# Altium footprint library NX Module baseboard.PcbLib: 96 footprints (part 3 of 6)
Each footprint in its own frame and in the unit in brackets; x right, y up, seen from the top. Pads: shape width x height; smd on the part's side, far side on the other; paste and mask are expansions set on the pad; w line width, h text height; cw(c..) or ccw(c..) is an arc to the next point about the centre after c.
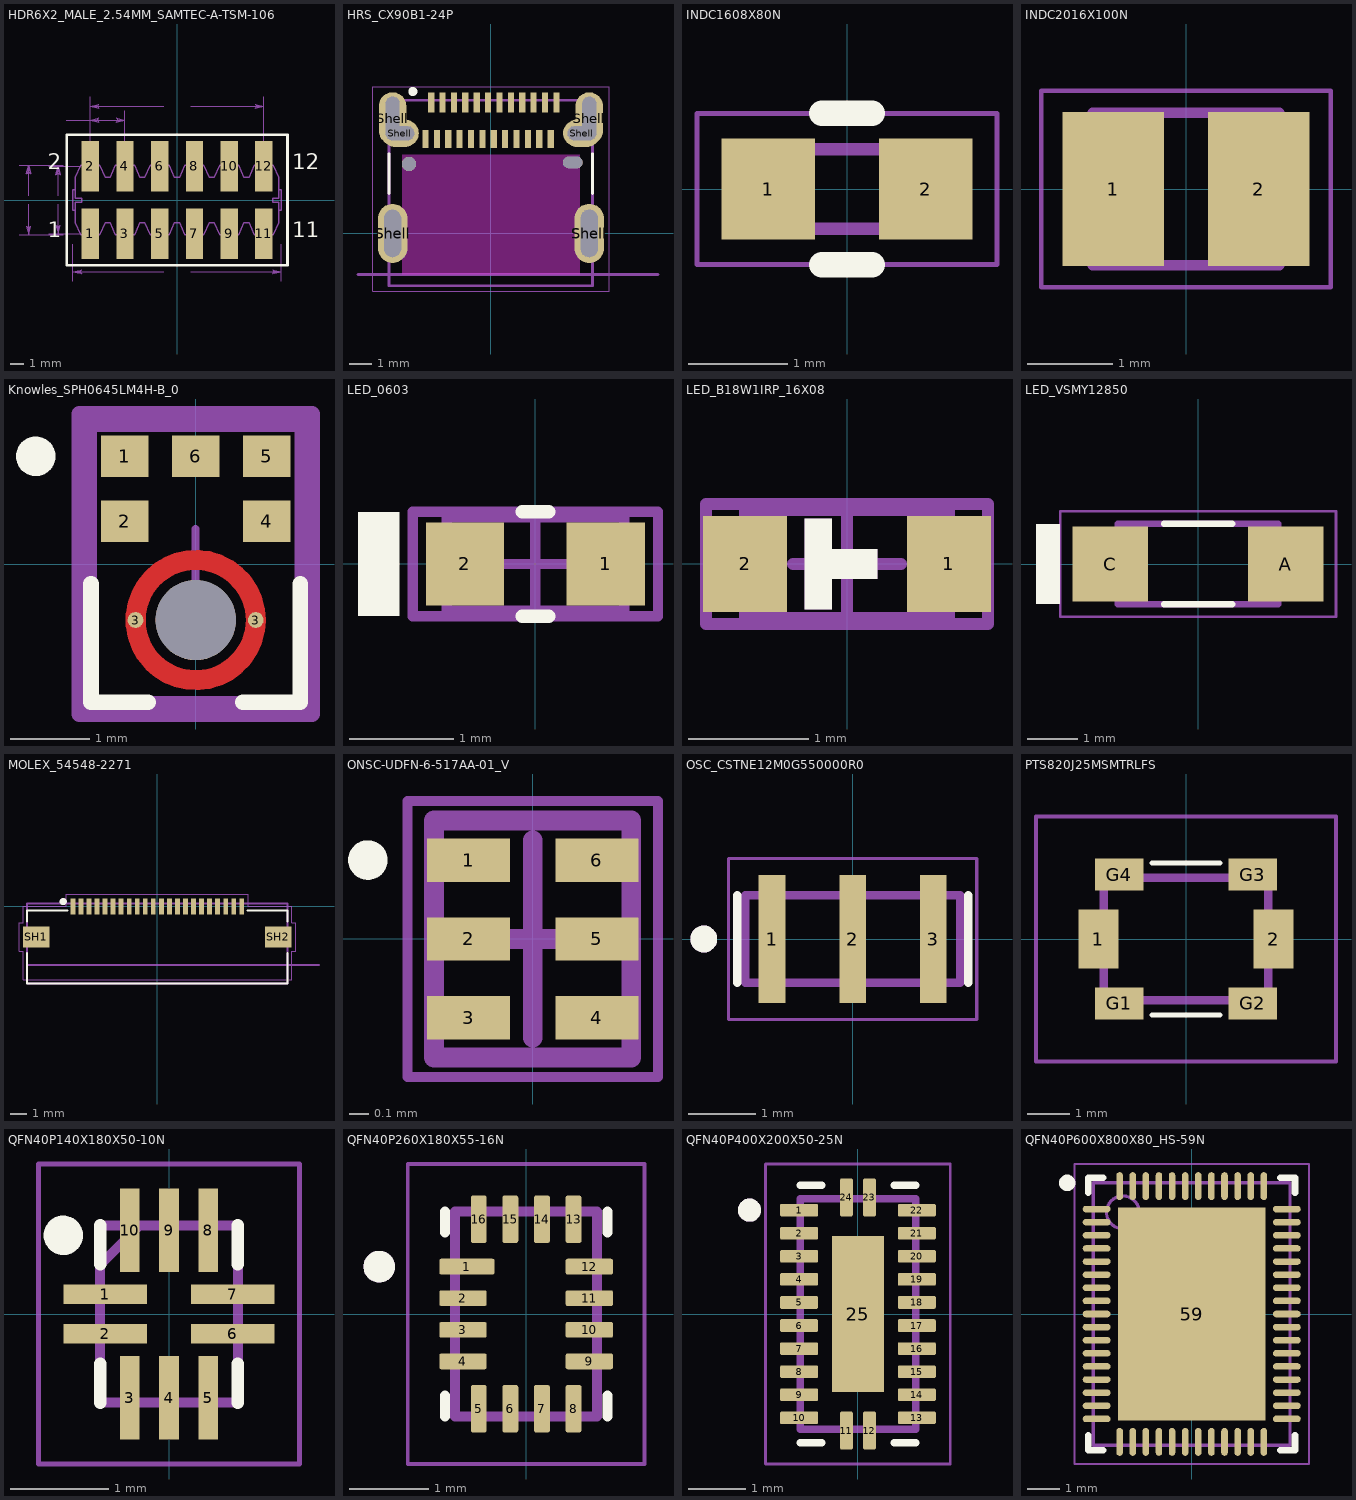
[diagram p2: the footprints below, top view; thin cyan lines are the x and y axes]

## HDR6X2_MALE_2.54MM_SAMTEC-A-TSM-106 [mm]
pads (12):
  rect 1.27x3.68 smd: 1(-6.35,-2.476) 2(-6.35,2.476) 3(-3.81,-2.476) 4(-3.81,2.476) 5(-1.27,-2.476) 6(-1.27,2.476) 7(1.27,-2.476) 8(1.27,2.476) 9(3.81,-2.476) 10(3.81,2.476) 11(6.35,-2.476) 12(6.35,2.476)
Top Overlay:
  lines w0.2: -8.07,-4.768 -8.07,4.768 8.07,4.768 8.07,-4.768 -8.07,-4.768
  text "1" at -9.44,-3.112 h1.97
  text "2" at -9.44,1.842 h1.97
  text "11" at 8.411,-3.112 h1.97
  text "12" at 8.411,1.842 h1.97
Top Paste:
  rectangle: -6.985,-4.316 -5.715,-0.636
  rectangle: -6.985,0.636 -5.715,4.316
  rectangle: -4.445,-4.316 -3.175,-0.636
  rectangle: -4.445,0.636 -3.175,4.316
  rectangle: -1.905,-4.316 -0.635,-0.636
  rectangle: -1.905,0.636 -0.635,4.316
  rectangle: 0.635,-4.316 1.905,-0.636
  rectangle: 0.635,0.636 1.905,4.316
  rectangle: 3.175,-4.316 4.445,-0.636
  rectangle: 3.175,0.636 4.445,4.316
  rectangle: 5.715,-4.316 6.985,-0.636
  rectangle: 5.715,0.636 6.985,4.316
Top Solder:
  rectangle: -7.036,-4.367 -5.664,-0.585
  rectangle: -7.036,0.585 -5.664,4.367
  rectangle: -4.496,-4.367 -3.124,-0.585
  rectangle: -4.496,0.585 -3.124,4.367
  rectangle: -1.956,-4.367 -0.584,-0.585
  rectangle: -1.956,0.585 -0.584,4.367
  rectangle: 0.584,-4.367 1.956,-0.585
  rectangle: 0.584,0.585 1.956,4.367
  rectangle: 3.124,-4.367 4.496,-0.585
  rectangle: 3.124,0.585 4.496,4.367
  rectangle: 5.664,-4.367 7.036,-0.585
  rectangle: 5.664,0.585 7.036,4.367
Mechanical 13:
  lines w0.1: -7.43,-0.762 -7.62,-0.762 -7.62,0.762 -7.43,0.762 ; -6.668,-2.54 -6.668,-3.721 -6.032,-3.721 -6.032,-2.54 ; -6.668,2.54 -6.668,3.721 -6.032,3.721 -6.032,2.54 ; -4.128,-2.54 -4.128,-3.721 -3.492,-3.721 -3.492,-2.54 ; -4.128,2.54 -4.128,3.721 -3.492,3.721 -3.492,2.54 ; -1.588,-2.54 -1.588,-3.721 -0.952,-3.721 -0.952,-2.54 ; -1.588,2.54 -1.588,3.721 -0.952,3.721 -0.952,2.54 ; 0.952,-2.54 0.952,-3.721 1.588,-3.721 1.588,-2.54 ; 0.952,2.54 0.952,3.721 1.588,3.721 1.588,2.54 ; 3.492,-2.54 3.492,-3.721 4.128,-3.721 4.128,-2.54 ; 3.492,2.54 3.492,3.721 4.128,3.721 4.128,2.54 ; 6.032,-2.54 6.032,-3.721 6.668,-3.721 6.668,-2.54 ; 6.032,2.54 6.032,3.721 6.668,3.721 6.668,2.54 ; 7.43,-0.762 7.43,-0.146 6.985,-0.146 6.985,0.146 7.43,0.146 7.43,0.762 ; 7.43,-0.762 7.62,-0.762 7.62,0.762 7.43,0.762 ; 7.43,-0.762 7.43,-1.651 7.048,-2.54 5.652,-2.54 5.27,-1.651 4.89,-1.651 4.508,-2.54 3.112,-2.54 2.73,-1.651 2.35,-1.651 1.968,-2.54 0.572,-2.54 0.19,-1.651 -0.19,-1.651 -0.572,-2.54 -1.968,-2.54 -2.35,-1.651 -2.73,-1.651 -3.112,-2.54 -4.508,-2.54 -4.89,-1.651 -5.27,-1.651 -5.652,-2.54 -7.048,-2.54 -7.43,-1.651 -7.43,-0.146 -6.985,-0.146 -6.985,0.146 -7.43,0.146 -7.43,1.651 -7.048,2.54 -5.652,2.54 -5.27,1.651 -4.89,1.651 -4.508,2.54 -3.112,2.54 -2.73,1.651 -2.35,1.651 -1.968,2.54 -0.572,2.54 -0.19,1.651 0.19,1.651 0.572,2.54 1.968,2.54 2.35,1.651 2.73,1.651 3.112,2.54 4.508,2.54 4.89,1.651 5.27,1.651 5.652,2.54 7.048,2.54 7.43,1.651 7.43,0.762
  text ".Designator" at -0.561,-0.375 h1.27
  text "12" at 8.411,1.842 h1.97
  text "11" at 8.411,-3.112 h1.97
  text "2" at -9.44,1.842 h1.97
  text "1" at -9.44,-3.112 h1.97
Mechanical 40:
  lines w0: -11.56,-2.54 -8.321,-2.54 ; -11.56,2.54 -8.321,2.54 ; -10.858,-0.318 -10.858,-2.54 ; -10.858,0.318 -10.858,2.54 ; -9.401,-2.476 -7.051,-2.476 ; -9.401,2.476 -7.051,2.476 ; -8.7,-0.318 -8.7,-2.476 ; -8.7,0.318 -8.7,2.476 ; -8.103,5.842 -6.35,5.842 ; -7.62,-5.946 -7.62,-3.241 ; -6.35,6.543 -6.35,3.178 -6.35,7.559 ; -3.81,3.178 -3.81,6.543 ; -0.991,-5.245 -7.62,-5.245 ; -0.991,6.858 -6.35,6.858 ; 0.991,-5.245 7.62,-5.245 ; 0.991,6.858 6.35,6.858 ; 6.35,3.178 6.35,7.559 ; 7.62,-5.946 7.62,-3.241 ; -11.017,-1.905 -10.858,-2.54 ; -11.017,-1.905 -10.858,-2.032 ; -11.017,-1.905 -10.938,-1.968 -10.858,-2.54 ; -10.858,-2.54 -10.7,-1.905 -10.858,-2.032 ; -10.858,-2.54 -10.779,-1.968 -10.858,-2.032 ; -10.858,-2.54 -10.858,-2.032 ; -10.858,2.032 -11.017,1.905 -10.858,2.54 ; -10.858,2.032 -10.7,1.905 ; -10.858,2.032 -10.938,1.968 -10.858,2.54 ; -10.858,2.032 -10.858,2.54 ; -10.858,2.54 -10.7,1.905 ; -10.858,2.54 -10.779,1.968 -10.7,1.905 ; -8.858,-1.842 -8.7,-2.476 ; -8.858,-1.842 -8.7,-1.968 ; -8.858,-1.842 -8.779,-1.905 -8.7,-2.476 ; -8.7,-2.476 -8.541,-1.842 -8.7,-1.968 ; -8.7,-2.476 -8.62,-1.905 -8.7,-1.968 ; -8.7,-2.476 -8.7,-1.968 ; -8.7,1.968 -8.858,1.842 -8.7,2.476 ; -8.7,1.968 -8.541,1.842 ; -8.7,1.968 -8.779,1.905 -8.7,2.476 ; -8.7,1.968 -8.7,2.476 ; -8.7,2.476 -8.541,1.842 ; -8.7,2.476 -8.62,1.905 -8.541,1.842 ; -7.62,-5.245 -6.985,-5.086 ; -7.62,-5.245 -6.985,-5.404 -7.112,-5.245 ; -7.62,-5.245 -7.048,-5.324 -7.112,-5.245 ; -7.62,-5.245 -7.112,-5.245 ; -7.62,-5.245 -7.048,-5.166 -6.985,-5.086 ; -7.112,-5.245 -6.985,-5.086 ; -6.35,5.842 -5.715,6.001 ; -6.35,5.842 -5.715,5.683 -5.842,5.842 ; -6.35,5.842 -5.778,5.763 -5.842,5.842 ; -6.35,5.842 -5.842,5.842 ; -6.35,5.842 -5.778,5.921 -5.715,6.001 ; -6.35,5.842 -3.81,5.842 ; -6.35,6.858 -5.715,7.017 ; -6.35,6.858 -5.715,6.699 -5.842,6.858 ; -6.35,6.858 -5.778,6.779 -5.842,6.858 ; -6.35,6.858 -5.842,6.858 ; -6.35,6.858 -5.778,6.937 -5.715,7.017 ; -5.842,5.842 -5.715,6.001 ; -5.842,6.858 -5.715,7.017 ; -4.445,5.683 -3.81,5.842 ; -4.445,5.683 -4.318,5.842 ; -4.445,5.683 -4.382,5.763 -3.81,5.842 ; -4.318,5.842 -4.445,6.001 -3.81,5.842 ; -4.318,5.842 -4.382,5.921 -3.81,5.842 ; -4.318,5.842 -3.81,5.842 ; 5.715,6.699 6.35,6.858 ; 5.715,6.699 5.842,6.858 ; 5.715,6.699 5.778,6.779 6.35,6.858 ; 5.842,6.858 5.715,7.017 6.35,6.858 ; 5.842,6.858 5.778,6.937 6.35,6.858 ; 5.842,6.858 6.35,6.858 ; 6.985,-5.404 7.62,-5.245 ; 6.985,-5.404 7.112,-5.245 ; 6.985,-5.404 7.048,-5.324 7.62,-5.245 ; 7.112,-5.245 6.985,-5.086 7.62,-5.245 ; 7.112,-5.245 7.048,-5.166 7.62,-5.245 ; 7.112,-5.245 7.62,-5.245
  text "4.953" at -9.36,-0.127 h0.39
  text "5.080" at -11.519,-0.127 h0.39
  text "2.540" at -9.614,5.715 h0.39
  text "15.240" at -0.8,-5.372 h0.39
  text "12.700" at -0.8,6.731 h0.39
Mechanical 42:
  lines w0.1: -8.07,-4.768 -8.07,4.768 8.07,4.768 8.07,-4.768 -8.07,-4.768
3D body "TSM-106-01-L-DV.stp": height 9.71, standoff 0.06, extent -7.62,-3.848 7.62,3.848

## HRS_CX90B1-24P [mm]
pads (32):
  rect 0.27x0.9 smd mask+0.05: A1(-2.625,5.75) A2(-2.125,5.75) A3(-1.625,5.75) A4(-1.125,5.75) A5(-0.625,5.75) A6(-0.125,5.75) A7(0.375,5.75) A8(0.875,5.75) A9(1.375,5.75) A10(1.875,5.75) A11(2.375,5.75) A12(2.875,5.75)
  rect 0.27x0.8 smd mask+0.05: B1(2.625,4.15) B2(2.125,4.15) B3(1.625,4.15) B4(1.125,4.15) B5(0.625,4.15) B6(0.125,4.15) B7(-0.375,4.15) B8(-0.875,4.15) B9(-1.375,4.15) B10(-1.875,4.15) B11(-2.375,4.15) B12(-2.875,4.15)
  oval 1.3x2.6 hole 0.75 slot 2.075 at 90 deg: Shell(-4.32,0) Shell(4.32,0)
  oval 1.2x2.3 hole 0.6 slot 1.9 at 90 deg mask+0: Shell(-4.32,5.05) Shell(4.32,5.05)
  oval 1.65x1.2 hole 0.6 slot 1.25 at 0 deg mask+0: Shell(-3.995,4.4) Shell(3.995,4.4)
  round 0.63 hole 0.63 unplated: ""(-3.6,3.05)
  oval 0.85x0.5 hole 0.5 slot 0.85 at 0 deg unplated: ""(3.6,3.115)
Top Overlay:
  circle w0.2: c-3.43,6.235 r0.1
  lines w0.127: -4.47,1.75 -4.47,3.5 ; 4.47,1.75 4.47,3.5
Keep-Out Layer:
  region: 3.9,-1.8 -3.9,-1.8 -3.9,3.45 3.9,3.45
Top Courtyard:
  lines w0.05: -5.2,-2.55 5.2,-2.55 5.2,6.45 -5.2,6.45 -5.2,-2.55
Mechanical 13:
  lines w0.127: -5.84,-1.8 7.34,-1.8 ; -4.47,-2.3 -4.47,5.85 4.47,5.85 4.47,-2.3 -4.47,-2.3
  text "PCB Edge" at 6.32,-1.59 h0.81
  text ".Designator" at -0.723,1.547 h1.27
3D body "step_temp.STEP": height 3.14, standoff -0.62, extent -4.47,-2.3 4.47,5.85

## INDC1608X80N [mm]
pads (2):
  rect 0.94x1.02 smd mask+0.051: 1(-0.79,0) 2(0.79,0)
Top Overlay:
  lines w0.254: -0.254,-0.762 0.254,-0.762 ; -0.254,0.762 0.254,0.762
Mechanical 13:
  lines w0.127: -0.8,-0.4 0.8,-0.4 0.8,0.4 -0.8,0.4 -0.8,-0.4
  text ".Designator" at -0.248,-0.432 h1.27
Mechanical 15:
  lines w0.05: -1.508,-0.758 1.508,-0.758 1.508,0.758 -1.508,0.758 -1.508,-0.758
3D body "DFE18SAN1R0ME0L.STEP": height 0.8, standoff 0, extent -0.8,-0.4 0.8,0.4

## INDC2016X100N [mm]
pads (2):
  rect 1.2x1.82 smd: 1(-0.86,0) 2(0.86,0)
Mechanical 13:
  lines w0.127: -1.1,-0.9 -1.1,0.9 1.1,0.9 1.1,-0.9 -1.1,-0.9
  text ".Designator" at 0.092,-0.406 h1.27
Mechanical 15:
  lines w0.05: -1.708,-1.158 -1.708,1.158 1.708,1.158 1.708,-1.158 -1.708,-1.158
3D body "step_temp.STEP": height 1, standoff 0, extent -1,-0.8 1,0.8

## Knowles_SPH0645LM4H-B_0 [mm]
pads (8):
  rect 0.6x0.522 smd paste+0 mask+0: 1(-0.9,1.364) 2(-0.9,0.542) 4(0.9,0.542) 5(0.9,1.364) 6(0,1.364)
  round 0.2 smd: 3(-0.762,-0.71) 3(0.762,-0.71)
  round 1.016 hole 1.016 unplated mask+0: ""(0,-0.71)
Top Layer:
  circle w0.254: c0,-0.71 r0.762
Top Overlay:
  circle w0.25: c-2.026,1.364 r0.125
  lines w0.2: -1.325,-0.25 -1.325,-1.75 -0.6,-1.75 ; 0.6,-1.75 1.325,-1.75 1.325,-0.25
Top Paste:
  circle w0.254: c0,-0.71 r0.762
Top Solder:
  circle w0.508: c0,-0.71 r0.762
Bottom Solder:
  circle w0.254: c0,-0.71 r0.635
Mechanical 13:
  lines w0.15: -1.325,-1.75 1.325,-1.75 1.325,1.75 -1.325,1.75 -1.325,-1.75
  text ".Designator" at 0,0 h1.27
Mechanical 15:
  lines w0.1: -0.443,0 0.443,0 ; 0,-0.443 0,0.443
  lines w0.2: -1.475,-1.9 -1.475,1.9 1.475,1.9 1.475,-1.9 -1.475,-1.9
3D body "sph0645lm4h-b.stp": height 1.23, standoff 0.25, extent -1.325,-1.75 1.325,1.75

## LED_0603 [mm]
pads (2):
  rect 0.75x0.8 smd: 1(0.675,0) 2(-0.675,0)
Top Overlay:
  rectangle: -1.7,-0.5 -1.3,0.5
  lines w0.127: -0.127,-0.5 0.127,-0.5 ; -0.127,0.5 0.127,0.5
Mechanical 13:
  lines w0.1: -0.85,-0.45 -0.85,0.45 0.85,0.45 0.85,-0.45 -0.85,-0.45
  text ".Designator" at 1.397,-0.381 h1.27
Mechanical 15:
  lines w0.1: -0.45,0 0.45,0 ; 0,-0.45 0,0.45 ; -1.175,-0.5 1.175,-0.5 1.175,0.5 -1.175,0.5 -1.175,-0.5
3D body "APT1608.STEP": height 0.63, standoff -0.13, extent -0.806,-0.4 0.805,0.4
3D body "LED SMD 0603.step": height 0.6, standoff 0, extent -0.8,-0.4 0.8,0.4

## LED_B18W1IRP_16X08 [mm]
pads (2):
  rect 0.7x0.8 smd mask+0.05: 1(0.85,0) 2(-0.85,0)
Top Overlay:
  rectangle: -0.254,-0.127 0.254,0.127
  rectangle: -0.356,-0.381 -0.127,0.381
Mechanical 13:
  rectangle: -0.254,-0.127 0.254,0.127
  rectangle: -0.356,-0.381 -0.127,0.381
  lines w0.1: -0.85,-0.45 -0.85,0.45 0.85,0.45 0.85,-0.45 -0.85,-0.45
  text ".Designator" at 1.397,-0.381 h1.27
Mechanical 15:
  lines w0.1: -0.45,0 0.45,0 ; 0,-0.45 0,0.45 ; -1.175,-0.5 1.175,-0.5 1.175,0.5 -1.175,0.5 -1.175,-0.5
3D body "APT1608.STEP": height 0.63, standoff -0.13, extent -0.806,-0.4 0.805,0.4
3D body "LED SMD 0603.step": height 0.6, standoff 0, extent -0.8,-0.4 0.8,0.4

## LED_VSMY12850 [mm]
pads (2):
  rect 1.5x1.5 smd mask+0.051: A(1.75,0) C(-1.75,0)
Top Overlay:
  rectangle: -3.232,-0.8 -2.75,0.8
  lines w0.127: -0.68,-0.8 0.68,-0.8 ; -0.68,0.8 0.68,0.8
Mechanical 13:
  lines w0.127: -1.127,-0.8 -1.127,0.8 ; -1.6,-0.8 1.6,-0.8 1.6,0.8 -1.6,0.8 -1.6,-0.8
  text ".Designator" at -0.286,-0.286 h1.27
Mechanical 15:
  lines w0.05: -2.75,-1.05 2.75,-1.05 2.75,1.05 -2.75,1.05 -2.75,-1.05
3D body "LED_12850_VIS.step": height 1.09, standoff 0, extent -1.6,-0.8 1.6,0.8

## MOLEX_54548-2271 [mm]
pads (24):
  rect 0.3x1 smd mask+0.05: 1(-5.25,0) 2(-4.75,0) 3(-4.25,0) 4(-3.75,0) 5(-3.25,0) 6(-2.75,0) 7(-2.25,0) 8(-1.75,0) 9(-1.25,0) 10(-0.75,0) 11(-0.25,0) 12(0.25,0) 13(0.75,0) 14(1.25,0) 15(1.75,0) 16(2.25,0) 17(2.75,0) 18(3.25,0) 19(3.75,0) 20(4.25,0) 21(4.75,0) 22(5.25,0)
  rect 1.65x1.3 smd: SH1(-7.525,-1.9) SH2(7.525,-1.9)
Top Overlay:
  circle w0.3: c-5.85,0.3 r0.071
  lines w0.127: -8.1,-2.9 -8.1,-4.8 8.1,-4.8 8.1,-2.9 ; -8.1,-0.95 -8.1,-0.25 -5.6,-0.25 ; 5.6,-0.25 8.1,-0.25 8.1,-0.95
Mechanical 13:
  circle w0.3: c-5.85,0.3 r0.071
  lines w0.127: -8.1,-3.65 8.1,-3.65 10.05,-3.65 ; -8.1,-4.8 -8.1,-3.15 -8.1,0.196 8.1,0.196 8.1,-3.15 8.1,-4.8 -8.1,-4.8
  text ".Designator" at -0.15,-2.263 h1.27
  text "Actuator Locked" at 8.588,-3.15 h1
Mechanical 15:
  lines w0.05: -8.6,-2.8 -8.6,-1 -8.35,-1 -8.35,0 -5.65,0 -5.65,0.75 5.65,0.75 5.65,0 8.35,0 8.35,-1 8.6,-1 8.6,-2.8 8.35,-2.8 8.35,-4.55 -8.35,-4.55 -8.35,-2.8 -8.6,-2.8
3D body "545482271.stp": height 1.18, standoff -0.02, extent -8.1,-4.804 8.1,0.196

## ONSC-UDFN-6-517AA-01_V [mm]
pads (6):
  rect 0.42x0.22 smd mask+0.051: 1(-0.325,0.4) 2(-0.325,0) 3(-0.325,-0.4) 4(0.325,-0.4) 5(0.325,0) 6(0.325,0.4)
Top Overlay:
  circle w0.1: c-0.835,0.4 r0.05
Mechanical 13:
  lines w0.1: -0.5,-0.6 -0.5,0.6 0.5,0.6 0.5,-0.6 -0.5,-0.6
  text ".Designator" at 0,-0.457 h1.27
Mechanical 15:
  lines w0.05: -0.635,-0.7 -0.635,0.7 0.635,0.7 0.635,-0.7 -0.635,-0.7
  lines w0.1: -0.5,0 0.5,0 ; 0,-0.5 0,0.5
3D body: height 0.55, standoff 0, extent -0.5,-0.6 0.5,0.6

## OSC_CSTNE12M0G550000R0 [mm]
pads (3):
  rect 0.4x1.9 smd: 1(-1.2,0) 2(0,0) 3(1.2,0)
Top Overlay:
  circle w0.2: c-2.22,0 r0.1
  lines w0.127: -1.72,-0.65 -1.72,0.65 ; 1.72,-0.65 1.72,0.65
Mechanical 13:
  circle w0.2: c-2.22,0 r0.1
  lines w0.127: -1.6,-0.65 -1.6,0.65 1.6,0.65 1.6,-0.65 -1.6,-0.65
  text ".Designator" at 0.092,-0.528 h1.27
Mechanical 15:
  lines w0.05: -1.85,-1.2 -1.85,1.2 1.85,1.2 1.85,-1.2 -1.85,-1.2
3D body "step_temp.STEP": height 0.8, standoff 0, extent -1.6,-0.65 1.6,0.65

## PTS820J25MSMTRLFS [mm]
pads (6):
  rect 0.95x1.4 smd: 1(-2.075,0) 2(2.075,0)
  rect 1.15x0.75 smd: G1(-1.575,-1.525) G2(1.575,-1.525) G3(1.575,1.525) G4(-1.575,1.525)
Top Overlay:
  lines w0.127: -0.8,-1.8 0.8,-1.8 ; -0.8,1.8 0.8,1.8
Mechanical 13:
  lines w0.2: -1.95,-1.45 1.95,-1.45 1.95,1.45 -1.95,1.45 -1.95,-1.45
  text ".Designator" at -0.889,-0.399 h1.52
Mechanical 15:
  lines w0.1: -3.55,-2.9 -3.55,2.9 3.55,2.9 3.55,-2.9 -3.55,-2.9
3D body "PUSHBUTTON-PTS820 v3.step": height 2.05, standoff 0.05, extent -2.25,-1.45 2.25,1.45

## QFN40P140X180X50-10N [mm]
pads (10):
  rect 0.85x0.2 smd mask+0.051: 1(-0.65,0.2) 2(-0.65,-0.2) 6(0.65,-0.2) 7(0.65,0.2)
  rect 0.2x0.85 smd mask+0.051: 3(-0.4,-0.85) 4(0,-0.85) 5(0.4,-0.85) 8(0.4,0.85) 9(0,0.85) 10(-0.4,0.85)
Top Overlay:
  circle w0.2: c-1.075,0.8 r0.1
  lines w0.127: -0.7,-0.9 -0.7,-0.508 ; -0.7,0.508 -0.7,0.9 ; 0.7,-0.9 0.7,-0.508 ; 0.7,0.508 0.7,0.9
Mechanical 13:
  lines w0.1: -0.7,0.5 -0.3,0.9 ; -0.7,-0.9 -0.7,0.9 0.7,0.9 0.7,-0.9 -0.7,-0.9
  text ".Designator" at -0.383,-0.157 h1.27
Mechanical 20:
  lines w0.05: -1.325,-1.525 1.325,-1.525 1.325,1.525 -1.325,1.525 -1.325,-1.525
3D body "74AVC1T1022GUX.stp": height 0.49, standoff 0.01, extent -0.7,-0.9 0.7,0.9

## QFN40P260X180X55-16N [mm]
pads (16):
  rrect25% 0.7x0.2 smd mask+0.051: 1(-0.75,0.6)
  rrect25% 0.6x0.2 smd mask+0.051: 2(-0.8,0.2) 3(-0.8,-0.2) 4(-0.8,-0.6) 9(0.8,-0.6) 10(0.8,-0.2) 11(0.8,0.2) 12(0.8,0.6)
  rrect25% 0.2x0.6 smd mask+0.051: 5(-0.6,-1.2) 6(-0.2,-1.2) 7(0.2,-1.2) 8(0.6,-1.2) 13(0.6,1.2) 14(0.2,1.2) 15(-0.2,1.2) 16(-0.6,1.2)
Top Overlay:
  circle w0.2: c-1.86,0.6 r0.1
  lines w0.127: -1.03,-1.3 -1.03,-1.03 ; -1.03,1.03 -1.03,1.3 ; 1.03,-1.3 1.03,-1.03 ; 1.03,1.03 1.03,1.3
Mechanical 13:
  circle w0.2: c-1.86,0.6 r0.1
  lines w0.127: -0.9,-1.3 -0.9,1.3 0.9,1.3 0.9,-1.3 -0.9,-1.3
  text ".Designator" at -0.24,-0.38 h1.27
Mechanical 15:
  lines w0.05: -1.5,-1.9 -1.5,1.9 1.5,1.9 1.5,-1.9 -1.5,-1.9
3D body "step_temp.STEP": height 0.55, standoff 0, extent -0.9,-1.3 0.9,1.3

## QFN40P400X200X50-25N [mm]
pads (25):
  rrect25% 0.66x0.22 smd mask+0.051: 1(-1.02,1.8) 2(-1.02,1.4) 3(-1.02,1) 4(-1.02,0.6) 5(-1.02,0.2) 6(-1.02,-0.2) 7(-1.02,-0.6) 8(-1.02,-1) 9(-1.02,-1.4) 10(-1.02,-1.8) 13(1.02,-1.8) 14(1.02,-1.4) 15(1.02,-1) 16(1.02,-0.6) 17(1.02,-0.2) 18(1.02,0.2) 19(1.02,0.6) 20(1.02,1) 21(1.02,1.4) 22(1.02,1.8)
  rrect25% 0.22x0.66 smd mask+0.051: 11(-0.2,-2.02) 12(0.2,-2.02) 23(0.2,2.02) 24(-0.2,2.02)
  rect 0.9x2.7 smd paste-2 mask+0.051: 25(0,0)
Top Overlay:
  circle w0.2: c-1.88,1.8 r0.1
  lines w0.127: -1,-2.23 -0.63,-2.23 ; -1,2.23 -0.63,2.23 ; 0.63,-2.23 1,-2.23 ; 0.63,2.23 1,2.23
Top Paste:
  region: -0.075,-0.825 -0.375,-0.825 -0.375,-0.525 -0.075,-0.525
  region: -0.075,-1.275 -0.375,-1.275 -0.375,-0.975 -0.075,-0.975
  region: 0.375,-1.275 0.075,-1.275 0.075,-0.975 0.375,-0.975
  region: 0.375,-0.825 0.075,-0.825 0.075,-0.525 0.375,-0.525
  region: 0.375,0.975 0.075,0.975 0.075,1.275 0.375,1.275
  region: 0.375,0.525 0.075,0.525 0.075,0.825 0.375,0.825
  region: -0.075,0.975 -0.375,0.975 -0.375,1.275 -0.075,1.275
  region: -0.075,0.525 -0.375,0.525 -0.375,0.825 -0.075,0.825
  region: -0.075,-0.375 -0.375,-0.375 -0.375,-0.075 -0.075,-0.075
  region: 0.375,-0.375 0.075,-0.375 0.075,-0.075 0.375,-0.075
  region: 0.375,0.075 0.075,0.075 0.075,0.375 0.375,0.375
  region: -0.075,0.075 -0.375,0.075 -0.375,0.375 -0.075,0.375
Mechanical 13:
  circle w0.2: c-1.88,1.8 r0.1
  lines w0.127: -1,-2 -1,2 1,2 1,-2 -1,-2
  text ".Designator" at -0.644,-0.31 h1.27
Mechanical 15:
  lines w0.05: -1.6,-2.6 -1.6,2.6 1.6,2.6 1.6,-2.6 -1.6,-2.6
3D body "step_temp.STEP": height 0.5, standoff 0, extent -1,-2 1,2

## QFN40P600X800X80_HS-59N [mm] "QFN, 58-Leads, Body 6.00x8.00mm, Pitch 0.40mm, Thermal Pad 4.50x6.50mm, IPC Medium Density"
height 0.8
pads (59):
  oval 0.85x0.2 smd: 1(-2.9,3.2) 2(-2.9,2.8) 3(-2.9,2.4) 4(-2.9,2) 5(-2.9,1.6) 6(-2.9,1.2) 7(-2.9,0.8) 8(-2.9,0.4) 9(-2.9,0) 10(-2.9,-0.4) 11(-2.9,-0.8) 12(-2.9,-1.2) 13(-2.9,-1.6) 14(-2.9,-2) 15(-2.9,-2.4) 16(-2.9,-2.8) 17(-2.9,-3.2) 30(2.9,-3.2) 31(2.9,-2.8) 32(2.9,-2.4) 33(2.9,-2) 34(2.9,-1.6) 35(2.9,-1.2) 36(2.9,-0.8) 37(2.9,-0.4) 38(2.9,0) 39(2.9,0.4) 40(2.9,0.8) 41(2.9,1.2) 42(2.9,1.6) 43(2.9,2) 44(2.9,2.4) 45(2.9,2.8) 46(2.9,3.2)
  oval 0.2x0.85 smd: 18(-2.2,-3.9) 19(-1.8,-3.9) 20(-1.4,-3.9) 21(-1,-3.9) 22(-0.6,-3.9) 23(-0.2,-3.9) 24(0.2,-3.9) 25(0.6,-3.9) 26(1,-3.9) 27(1.4,-3.9) 28(1.8,-3.9) 29(2.2,-3.9) 47(2.2,3.9) 48(1.8,3.9) 49(1.4,3.9) 50(1,3.9) 51(0.6,3.9) 52(0.2,3.9) 53(-0.2,3.9) 54(-0.6,3.9) 55(-1,3.9) 56(-1.4,3.9) 57(-1.8,3.9) 58(-2.2,3.9)
  rect 4.5x6.5 smd: 59(0,0)
Top Overlay:
  circle w0.25: c-3.8,4 r0.125
  lines w0.2: -3.15,-3.7 -3.15,-4.15 -2.7,-4.15 ; -3.15,3.7 -3.15,4.15 -2.7,4.15 ; 2.7,-4.15 3.15,-4.15 3.15,-3.7 ; 2.7,4.15 3.15,4.15 3.15,3.7
Top Courtyard:
  lines w0.05: -3.575,-4.575 3.575,-4.575 3.575,4.575 -3.575,4.575 -3.575,-4.575
  lines w0.1: -0.5,0 0.5,0 ; 0,-0.5 0,0.5
Mechanical 13:
  circle w0.1: c-2.1,3.1 r0.5
  lines w0.1: -3,-4 3,-4 3,4 -3,4 -3,-4
  text ".Designator" at -2.068,-0.367 h1.27
3D body "QFN40P600X800X80_HS-59N.step": height 0.8, standoff 0, extent -3.01,-4.01 3.01,4.01